# Altium footprint library MCU.PcbLib: 44 footprints (part 2 of 3)
Each footprint in its own frame and in the unit in brackets; x right, y up, seen from the top. Pads: shape width x height; smd on the part's side, far side on the other; paste and mask are expansions set on the pad; w line width, h text height; cw(c..) or ccw(c..) is an arc to the next point about the centre after c.
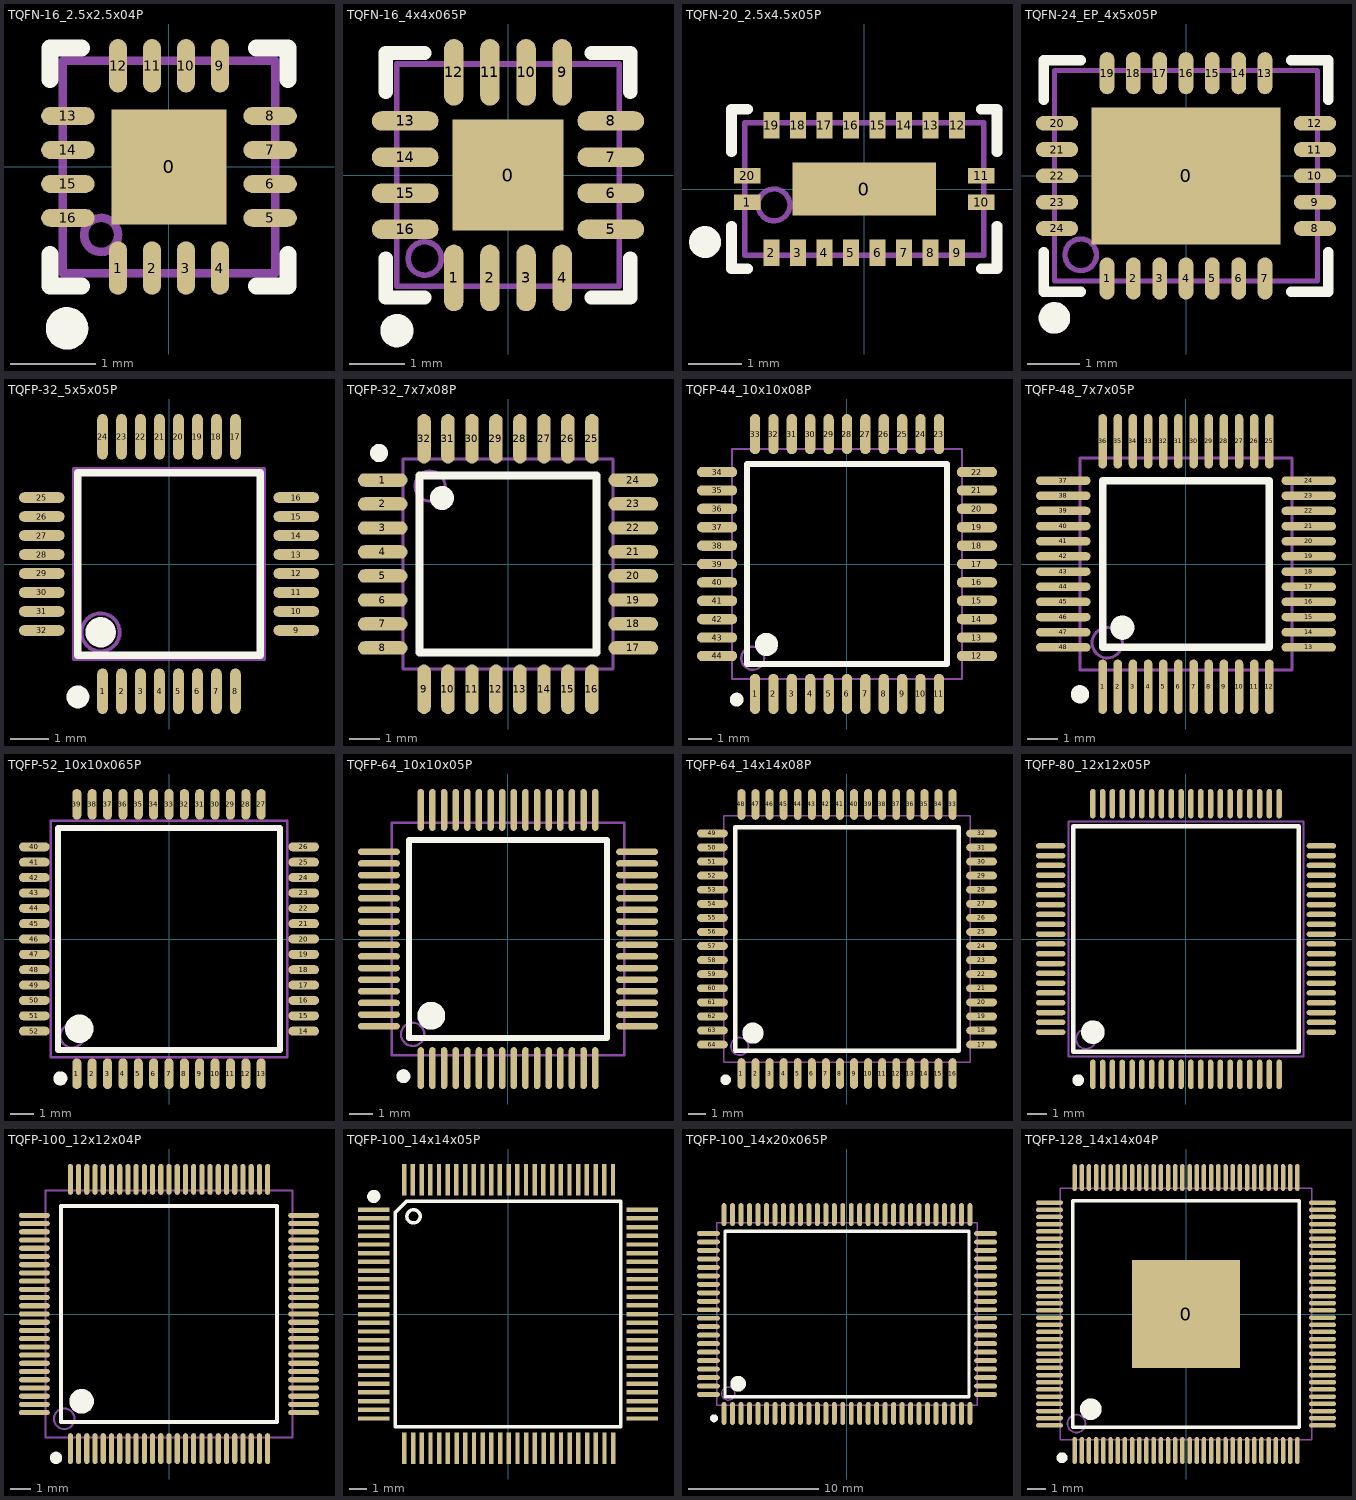
[diagram p1: the footprints below, top view; thin cyan lines are the x and y axes]

## TQFN-16_2.5x2.5x04P [mm] "QFN, 16-Leads, Body 3.00x3.00mm, Pitch 0.50mm, Thermal Pad 1.70x1.70mm, IPC Medium Density"
height 1
pads (17):
  rect 1.35x1.35 smd mask+0.051: 0(0,0)
  oval 0.21x0.63 smd mask+0.051: 1(-0.6,-1.19) 2(-0.2,-1.19) 3(0.2,-1.19) 4(0.6,-1.19) 9(0.6,1.19) 10(0.2,1.19) 11(-0.2,1.19) 12(-0.6,1.19)
  oval 0.63x0.21 smd mask+0.051: 5(1.19,-0.6) 6(1.19,-0.2) 7(1.19,0.2) 8(1.19,0.6) 13(-1.19,0.6) 14(-1.19,0.2) 15(-1.19,-0.2) 16(-1.19,-0.6)
Top Overlay:
  circle w0.25: c-1.2,-1.9 r0.125
  lines w0.2: -1.4,-1.03 -1.4,-1.4 -1.03,-1.4 ; -1.4,1.03 -1.4,1.4 -1.03,1.4 ; 1.03,-1.4 1.4,-1.4 1.4,-1.03 ; 1.03,1.4 1.4,1.4 1.4,1.03
Mechanical 13:
  circle w0.1: c-0.8,-0.8 r0.2
  lines w0.1: -1.25,-1.25 1.25,-1.25 1.25,1.25 -1.25,1.25 -1.25,-1.25

## TQFN-16_4x4x065P [mm] "QFN, 16-Leads, Body 3.00x3.00mm, Pitch 0.50mm, Thermal Pad 1.70x1.70mm, IPC Medium Density"
height 1
pads (17):
  rect 2x2 smd mask+0.051: 0(0,0)
  oval 0.35x1.2 smd mask+0.051: 1(-0.975,-1.85) 2(-0.325,-1.85) 3(0.325,-1.85) 4(0.975,-1.85) 9(0.975,1.85) 10(0.325,1.85) 11(-0.325,1.85) 12(-0.975,1.85)
  oval 1.2x0.35 smd mask+0.051: 5(1.85,-0.975) 6(1.85,-0.325) 7(1.85,0.325) 8(1.85,0.975) 13(-1.85,0.975) 14(-1.85,0.325) 15(-1.85,-0.325) 16(-1.85,-0.975)
Top Overlay:
  circle w0.3: c-2,-2.8 r0.15
  lines w0.254: -2.2,-1.5 -2.2,-2.2 -1.5,-2.2 ; -2.2,1.5 -2.2,2.2 -1.5,2.2 ; 1.5,-2.2 2.2,-2.2 2.2,-1.5 ; 1.5,2.2 2.2,2.2 2.2,1.5
Mechanical 13:
  circle w0.1: c-1.5,-1.5 r0.3
  lines w0.1: -2,-2 -2,2 2,2 2,-2 -2,-2

## TQFN-20_2.5x4.5x05P [mm]
pads (21):
  rect 2.7x1 smd mask+0.051: 0(0,0)
  rect 0.5x0.3 smd mask+0.051: 1(-2.2,-0.25) 10(2.2,-0.25) 11(2.2,0.25) 20(-2.2,0.25)
  rect 0.3x0.5 smd mask+0.051: 2(-1.75,-1.2) 3(-1.25,-1.2) 4(-0.75,-1.2) 5(-0.25,-1.2) 6(0.25,-1.2) 7(0.75,-1.2) 8(1.25,-1.2) 9(1.75,-1.2) 12(1.75,1.2) 13(1.25,1.2) 14(0.75,1.2) 15(0.25,1.2) 16(-0.25,1.2) 17(-0.75,1.2) 18(-1.25,1.2) 19(-1.75,1.2)
Top Overlay:
  circle w0.3: c-3,-1 r0.15
  lines w0.2: -2.5,-0.7 -2.5,-1.5 -2.2,-1.5 ; -2.5,0.7 -2.5,1.5 -2.2,1.5 ; 2.2,-1.5 2.5,-1.5 2.5,-0.7 ; 2.2,1.5 2.5,1.5 2.5,0.7
Mechanical 13:
  circle w0.1: c-1.7,-0.3 r0.3
  lines w0.1: -2.25,-1.25 2.25,-1.25 2.25,1.25 -2.25,1.25 -2.25,-1.25

## TQFN-24_EP_4x5x05P [mm]
pads (25):
  rect 3.6x2.6 smd mask+0.051: 0(0,0)
  oval 0.28x0.8 smd mask+0.051: 1(-1.5,-1.95) 2(-1,-1.95) 3(-0.5,-1.95) 4(0,-1.95) 5(0.5,-1.95) 6(1,-1.95) 7(1.5,-1.95) 13(1.5,1.95) 14(1,1.95) 15(0.5,1.95) 16(0,1.95) 17(-0.5,1.95) 18(-1,1.95) 19(-1.5,1.95)
  oval 0.8x0.28 smd mask+0.051: 8(2.45,-1) 9(2.45,-0.5) 10(2.45,0) 11(2.45,0.5) 12(2.45,1) 20(-2.45,1) 21(-2.45,0.5) 22(-2.45,0) 23(-2.45,-0.5) 24(-2.45,-1)
Top Overlay:
  circle w0.3: c-2.5,-2.7 r0.15
  lines w0.2: -2.7,-1.45 -2.7,-2.2 -2,-2.2 ; -2.7,1.45 -2.7,2.2 -2,2.2 ; 2,-2.2 2.7,-2.2 2.7,-1.45 ; 2,2.2 2.7,2.2 2.7,1.45
Mechanical 13:
  circle w0.1: c-2,-1.5 r0.3
  lines w0.1: -2.5,-2 2.5,-2 2.5,2 -2.5,2 -2.5,-2

## TQFP-32_5x5x05P [mm]
pads (32):
  oval 0.28x1.2 smd mask+0.051: 1(-1.75,-3.35) 2(-1.25,-3.35) 3(-0.75,-3.35) 4(-0.25,-3.35) 5(0.25,-3.35) 6(0.75,-3.35) 7(1.25,-3.35) 8(1.75,-3.35) 17(1.75,3.35) 18(1.25,3.35) 19(0.75,3.35) 20(0.25,3.35) 21(-0.25,3.35) 22(-0.75,3.35) 23(-1.25,3.35) 24(-1.75,3.35)
  oval 1.2x0.28 smd mask+0.051: 9(3.35,-1.75) 10(3.35,-1.25) 11(3.35,-0.75) 12(3.35,-0.25) 13(3.35,0.25) 14(3.35,0.75) 15(3.35,1.25) 16(3.35,1.75) 25(-3.35,1.75) 26(-3.35,1.25) 27(-3.35,0.75) 28(-3.35,0.25) 29(-3.35,-0.25) 30(-3.35,-0.75) 31(-3.35,-1.25) 32(-3.35,-1.75)
Top Overlay:
  circle w0.3: c-2.4,-3.5 r0.15
  circle w0.4: c-1.8,-1.8 r0.2
  lines w0.2: -2.4,-2.4 -2.4,2.4 2.4,2.4 2.4,-2.4 -2.4,-2.4
Mechanical 13:
  circle w0.1: c-1.8,-1.8 r0.5
  lines w0.1: -2.5,-2.5 -2.5,2.5 2.5,2.5 2.5,-2.5 -2.5,-2.5

## TQFP-32_7x7x08P [mm]
pads (32):
  oval 1.65x0.45 smd: 1(-4.175,2.8) 2(-4.175,2) 3(-4.175,1.2) 4(-4.175,0.4) 5(-4.175,-0.4) 6(-4.175,-1.2) 7(-4.175,-2) 8(-4.175,-2.8) 17(4.175,-2.8) 18(4.175,-2) 19(4.175,-1.2) 20(4.175,-0.4) 21(4.175,0.4) 22(4.175,1.2) 23(4.175,2) 24(4.175,2.8)
  oval 0.45x1.65 smd: 9(-2.8,-4.175) 10(-2,-4.175) 11(-1.2,-4.175) 12(-0.4,-4.175) 13(0.4,-4.175) 14(1.2,-4.175) 15(2,-4.175) 16(2.8,-4.175) 25(2.8,4.175) 26(2,4.175) 27(1.2,4.175) 28(0.4,4.175) 29(-0.4,4.175) 30(-1.2,4.175) 31(-2,4.175) 32(-2.8,4.175)
Top Overlay:
  circle w0.3: c-4.3,3.7 r0.15
  circle w0.4: c-2.2,2.2 r0.2
  lines w0.254: -2.95,-2.95 2.95,-2.95 2.95,2.95 -2.95,2.95 -2.95,-2.95
Mechanical 13:
  circle w0.1: c-2.6,2.6 r0.5
  lines w0.1: -3.5,-3.5 3.5,-3.5 3.5,3.5 -3.5,3.5 -3.5,-3.5
3D body: height 1.13, standoff 0.03, extent -4.794,-4.806 4.806,4.794

## TQFP-44_10x10x08P [mm]
pads (44):
  oval 0.45x1.75 smd: 1(-4,-5.65) 2(-3.2,-5.65) 3(-2.4,-5.65) 4(-1.6,-5.65) 5(-0.8,-5.65) 6(0,-5.65) 7(0.8,-5.65) 8(1.6,-5.65) 9(2.4,-5.65) 10(3.2,-5.65) 11(4,-5.65) 23(4,5.65) 24(3.2,5.65) 25(2.4,5.65) 26(1.6,5.65) 27(0.8,5.65) 28(0,5.65) 29(-0.8,5.65) 30(-1.6,5.65) 31(-2.4,5.65) 32(-3.2,5.65) 33(-4,5.65)
  oval 1.75x0.45 smd: 12(5.65,-4) 13(5.65,-3.2) 14(5.65,-2.4) 15(5.65,-1.6) 16(5.65,-0.8) 17(5.65,0) 18(5.65,0.8) 19(5.65,1.6) 20(5.65,2.4) 21(5.65,3.2) 22(5.65,4) 34(-5.65,4) 35(-5.65,3.2) 36(-5.65,2.4) 37(-5.65,1.6) 38(-5.65,0.8) 39(-5.65,0) 40(-5.65,-0.8) 41(-5.65,-1.6) 42(-5.65,-2.4) 43(-5.65,-3.2) 44(-5.65,-4)
Top Overlay:
  circle w0.3: c-4.8,-5.9 r0.15
  circle w0.5: c-3.5,-3.5 r0.25
  lines w0.254: -4.35,-4.35 4.35,-4.35 4.35,4.35 -4.35,4.35 -4.35,-4.35
Mechanical 13:
  circle w0.1: c-4.1,-4.1 r0.5
  lines w0.1: -5,-5 5,-5 5,5 -5,5 -5,-5
3D body: height 1.1, standoff 0, extent -6.02,-6.025 5.98,5.975

## TQFP-48_7x7x05P [mm]
pads (48):
  oval 0.28x1.8 smd mask+0.051: 1(-2.75,-4.05) 2(-2.25,-4.05) 3(-1.75,-4.05) 4(-1.25,-4.05) 5(-0.75,-4.05) 6(-0.25,-4.05) 7(0.25,-4.05) 8(0.75,-4.05) 9(1.25,-4.05) 10(1.75,-4.05) 11(2.25,-4.05) 12(2.75,-4.05) 25(2.75,4.05) 26(2.25,4.05) 27(1.75,4.05) 28(1.25,4.05) 29(0.75,4.05) 30(0.25,4.05) 31(-0.25,4.05) 32(-0.75,4.05) 33(-1.25,4.05) 34(-1.75,4.05) 35(-2.25,4.05) 36(-2.75,4.05)
  oval 1.8x0.28 smd mask+0.051: 13(4.05,-2.75) 14(4.05,-2.25) 15(4.05,-1.75) 16(4.05,-1.25) 17(4.05,-0.75) 18(4.05,-0.25) 19(4.05,0.25) 20(4.05,0.75) 21(4.05,1.25) 22(4.05,1.75) 23(4.05,2.25) 24(4.05,2.75) 37(-4.05,2.75) 38(-4.05,2.25) 39(-4.05,1.75) 40(-4.05,1.25) 41(-4.05,0.75) 42(-4.05,0.25) 43(-4.05,-0.25) 44(-4.05,-0.75) 45(-4.05,-1.25) 46(-4.05,-1.75) 47(-4.05,-2.25) 48(-4.05,-2.75)
Top Overlay:
  circle w0.4: c-2.1,-2.1 r0.2
  circle w0.3: c-3.5,-4.3 r0.15
  lines w0.254: -2.75,-2.75 -2.75,2.75 2.75,2.75 2.75,-2.75 -2.75,-2.75
Mechanical 13:
  circle w0.1: c-2.6,-2.6 r0.5
  lines w0.1: -3.5,-3.5 -3.5,3.5 3.5,3.5 3.5,-3.5 -3.5,-3.5

## TQFP-52_10x10x065P [mm]
pads (52):
  oval 0.38x1.3 smd mask+0.051: 1(-3.9,-5.7) 2(-3.25,-5.7) 3(-2.6,-5.7) 4(-1.95,-5.7) 5(-1.3,-5.7) 6(-0.65,-5.7) 7(0,-5.7) 8(0.65,-5.7) 9(1.3,-5.7) 10(1.95,-5.7) 11(2.6,-5.7) 12(3.25,-5.7) 13(3.9,-5.7) 27(3.9,5.7) 28(3.25,5.7) 29(2.6,5.7) 30(1.95,5.7) 31(1.3,5.7) 32(0.65,5.7) 33(0,5.7) 34(-0.65,5.7) 35(-1.3,5.7) 36(-1.95,5.7) 37(-2.6,5.7) 38(-3.25,5.7) 39(-3.9,5.7)
  oval 1.3x0.38 smd mask+0.051: 14(5.7,-3.9) 15(5.7,-3.25) 16(5.7,-2.6) 17(5.7,-1.95) 18(5.7,-1.3) 19(5.7,-0.65) 20(5.7,0) 21(5.7,0.65) 22(5.7,1.3) 23(5.7,1.95) 24(5.7,2.6) 25(5.7,3.25) 26(5.7,3.9) 40(-5.7,3.9) 41(-5.7,3.25) 42(-5.7,2.6) 43(-5.7,1.95) 44(-5.7,1.3) 45(-5.7,0.65) 46(-5.7,0) 47(-5.7,-0.65) 48(-5.7,-1.3) 49(-5.7,-1.95) 50(-5.7,-2.6) 51(-5.7,-3.25) 52(-5.7,-3.9)
Top Overlay:
  circle w0.3: c-4.6,-5.9 r0.15
  circle w0.6: c-3.8,-3.8 r0.3
  lines w0.254: -4.7,-4.7 -4.7,4.7 4.7,4.7 4.7,-4.7 -4.7,-4.7
Mechanical 13:
  circle w0.1: c-4.1,-4.1 r0.5
  lines w0.1: -5,-5 -5,5 5,5 5,-5 -5,-5

## TQFP-64_10x10x05P [mm]
pads (64):
  oval 0.28x1.8 smd mask+0.051: 1(-3.75,-5.55) 2(-3.25,-5.55) 3(-2.75,-5.55) 4(-2.25,-5.55) 5(-1.75,-5.55) 6(-1.25,-5.55) 7(-0.75,-5.55) 8(-0.25,-5.55) 9(0.25,-5.55) 10(0.75,-5.55) 11(1.25,-5.55) 12(1.75,-5.55) 13(2.25,-5.55) 14(2.75,-5.55) 15(3.25,-5.55) 16(3.75,-5.55) 33(3.75,5.55) 34(3.25,5.55) 35(2.75,5.55) 36(2.25,5.55) 37(1.75,5.55) 38(1.25,5.55) 39(0.75,5.55) 40(0.25,5.55) 41(-0.25,5.55) 42(-0.75,5.55) 43(-1.25,5.55) 44(-1.75,5.55) 45(-2.25,5.55) 46(-2.75,5.55) 47(-3.25,5.55) 48(-3.75,5.55)
  oval 1.8x0.28 smd mask+0.051: 17(5.55,-3.75) 18(5.55,-3.25) 19(5.55,-2.75) 20(5.55,-2.25) 21(5.55,-1.75) 22(5.55,-1.25) 23(5.55,-0.75) 24(5.55,-0.25) 25(5.55,0.25) 26(5.55,0.75) 27(5.55,1.25) 28(5.55,1.75) 29(5.55,2.25) 30(5.55,2.75) 31(5.55,3.25) 32(5.55,3.75) 49(-5.55,3.75) 50(-5.55,3.25) 51(-5.55,2.75) 52(-5.55,2.25) 53(-5.55,1.75) 54(-5.55,1.25) 55(-5.55,0.75) 56(-5.55,0.25) 57(-5.55,-0.25) 58(-5.55,-0.75) 59(-5.55,-1.25) 60(-5.55,-1.75) 61(-5.55,-2.25) 62(-5.55,-2.75) 63(-5.55,-3.25) 64(-5.55,-3.75)
Top Overlay:
  circle w0.3: c-4.5,-5.9 r0.15
  circle w0.6: c-3.3,-3.3 r0.3
  lines w0.254: -4.25,-4.25 -4.25,4.25 4.25,4.25 4.25,-4.25 -4.25,-4.25
Mechanical 13:
  circle w0.1: c-4.1,-4.1 r0.5
  lines w0.1: -5,-5 -5,5 5,5 5,-5 -5,-5

## TQFP-64_14x14x08P [mm]
pads (64):
  oval 0.45x1.75 smd: 1(-6,-7.65) 2(-5.2,-7.65) 3(-4.4,-7.65) 4(-3.6,-7.65) 5(-2.8,-7.65) 6(-2,-7.65) 7(-1.2,-7.65) 8(-0.4,-7.65) 9(0.4,-7.65) 10(1.2,-7.65) 11(2,-7.65) 12(2.8,-7.65) 13(3.6,-7.65) 14(4.4,-7.65) 15(5.2,-7.65) 16(6,-7.65) 33(6,7.65) 34(5.2,7.65) 35(4.4,7.65) 36(3.6,7.65) 37(2.8,7.65) 38(2,7.65) 39(1.2,7.65) 40(0.4,7.65) 41(-0.4,7.65) 42(-1.2,7.65) 43(-2,7.65) 44(-2.8,7.65) 45(-3.6,7.65) 46(-4.4,7.65) 47(-5.2,7.65) 48(-6,7.65)
  oval 1.75x0.45 smd: 17(7.65,-6) 18(7.65,-5.2) 19(7.65,-4.4) 20(7.65,-3.6) 21(7.65,-2.8) 22(7.65,-2) 23(7.65,-1.2) 24(7.65,-0.4) 25(7.65,0.4) 26(7.65,1.2) 27(7.65,2) 28(7.65,2.8) 29(7.65,3.6) 30(7.65,4.4) 31(7.65,5.2) 32(7.65,6) 49(-7.65,6) 50(-7.65,5.2) 51(-7.65,4.4) 52(-7.65,3.6) 53(-7.65,2.8) 54(-7.65,2) 55(-7.65,1.2) 56(-7.65,0.4) 57(-7.65,-0.4) 58(-7.65,-1.2) 59(-7.65,-2) 60(-7.65,-2.8) 61(-7.65,-3.6) 62(-7.65,-4.4) 63(-7.65,-5.2) 64(-7.65,-6)
Top Overlay:
  circle w0.3: c-6.9,-8 r0.15
  circle w0.6: c-5.35,-5.35 r0.3
  lines w0.254: -6.35,-6.35 -6.35,6.35 6.35,6.35 6.35,-6.35 -6.35,-6.35
Mechanical 13:
  circle w0.1: c-6.1,-6.1 r0.5
  lines w0.1: -7,-7 -7,7 7,7 7,-7 -7,-7

## TQFP-80_12x12x05P [mm]
pads (81):
  oval 0.28x1.5 smd mask+0.051: 1(-4.75,-6.9) 2(-4.25,-6.9) 3(-3.75,-6.9) 4(-3.25,-6.9) 5(-2.75,-6.9) 6(-2.25,-6.9) 7(-1.75,-6.9) 8(-1.25,-6.9) 9(-0.75,-6.9) 10(-0.25,-6.9) 11(0.25,-6.9) 12(0.75,-6.9) 13(1.25,-6.9) 14(1.75,-6.9) 15(2.25,-6.9) 16(2.75,-6.9) 17(3.25,-6.9) 18(3.75,-6.9) 19(4.25,-6.9) 20(4.75,-6.9) 41(4.75,6.9) 42(4.25,6.9) 43(3.75,6.9) 44(3.25,6.9) 45(2.75,6.9) 46(2.25,6.9) 47(1.75,6.9) 48(1.25,6.9) 49(0.75,6.9) 50(0.25,6.9) 51(-0.25,6.9) 52(-0.75,6.9) 53(-1.25,6.9) 54(-1.75,6.9) 55(-2.25,6.9) 56(-2.75,6.9) 57(-3.25,6.9) 58(-3.75,6.9) 59(-4.25,6.9) 60(-4.75,6.9)
  oval 1.5x0.28 smd mask+0.051: 21(6.9,-4.75) 22(6.9,-4.25) 23(6.9,-3.75) 24(6.9,-3.25) 25(6.9,-2.75) 26(6.9,-2.25) 27(6.9,-1.75) 28(6.9,-1.25) 29(6.9,-0.75) 30(6.9,-0.25) 31(6.9,0.25) 32(6.9,0.75) 33(6.9,1.25) 34(6.9,1.75) 35(6.9,2.25) 36(6.9,2.75) 37(6.9,3.25) 38(6.9,3.75) 39(6.9,4.25) 40(6.9,4.75) 61(-6.9,4.75) 62(-6.9,4.25) 63(-6.9,3.75) 64(-6.9,3.25) 65(-6.9,2.75) 66(-6.9,2.25) 67(-6.9,1.75) 68(-6.9,1.25) 69(-6.9,0.75) 70(-6.9,0.25) 71(-6.9,-0.25) 72(-6.9,-0.75) 73(-6.9,-1.25) 74(-6.9,-1.75) 75(-6.9,-2.25) 76(-6.9,-2.75) 77(-6.9,-3.25) 78(-6.9,-3.75) 79(-6.9,-4.25) 80(-6.9,-4.75)
  oval 1.5x0 smd mask+0.051: 74(-6.9,-1.75)
Top Overlay:
  circle w0.6: c-4.75,-4.75 r0.3
  circle w0.3: c-5.5,-7.2 r0.15
  lines w0.254: -5.75,-5.75 5.75,-5.75 5.75,5.75 -5.75,5.75 -5.75,-5.75
Mechanical 13:
  circle w0.1: c-5.1,-5.1 r0.5
  lines w0.1: -6,-6 6,-6 6,6 -6,6 -6,-6

## TQFP-100_12x12x04P [mm]
pads (100):
  oval 0.25x1.5 smd mask+0.051: 1(-4.8,-6.55) 2(-4.4,-6.55) 3(-4,-6.55) 4(-3.6,-6.55) 5(-3.2,-6.55) 6(-2.8,-6.55) 7(-2.4,-6.55) 8(-2,-6.55) 9(-1.6,-6.55) 10(-1.2,-6.55) 11(-0.8,-6.55) 12(-0.4,-6.55) 13(0,-6.55) 14(0.4,-6.55) 15(0.8,-6.55) 16(1.2,-6.55) 17(1.6,-6.55) 18(2,-6.55) 19(2.4,-6.55) 20(2.8,-6.55) 21(3.2,-6.55) 22(3.6,-6.55) 23(4,-6.55) 24(4.4,-6.55) 25(4.8,-6.55) 51(4.8,6.55) 52(4.4,6.55) 53(4,6.55) 54(3.6,6.55) 55(3.2,6.55) 56(2.8,6.55) 57(2.4,6.55) 58(2,6.55) 59(1.6,6.55) 60(1.2,6.55) 61(0.8,6.55) 62(0.4,6.55) 63(0,6.55) 64(-0.4,6.55) 65(-0.8,6.55) 66(-1.2,6.55) 67(-1.6,6.55) 68(-2,6.55) 69(-2.4,6.55) 70(-2.8,6.55) 71(-3.2,6.55) 72(-3.6,6.55) 73(-4,6.55) 74(-4.4,6.55) 75(-4.8,6.55)
  oval 1.5x0.25 smd mask+0.051: 26(6.55,-4.8) 27(6.55,-4.4) 28(6.55,-4) 29(6.55,-3.6) 30(6.55,-3.2) 31(6.55,-2.8) 32(6.55,-2.4) 33(6.55,-2) 34(6.55,-1.6) 35(6.55,-1.2) 36(6.55,-0.8) 37(6.55,-0.4) 38(6.55,0) 39(6.55,0.4) 40(6.55,0.8) 41(6.55,1.2) 42(6.55,1.6) 43(6.55,2) 44(6.55,2.4) 45(6.55,2.8) 46(6.55,3.2) 47(6.55,3.6) 48(6.55,4) 49(6.55,4.4) 50(6.55,4.8) 76(-6.55,4.8) 77(-6.55,4.4) 78(-6.55,4) 79(-6.55,3.6) 80(-6.55,3.2) 81(-6.55,2.8) 82(-6.55,2.4) 83(-6.55,2) 84(-6.55,1.6) 85(-6.55,1.2) 86(-6.55,0.8) 87(-6.55,0.4) 88(-6.55,0) 89(-6.55,-0.4) 90(-6.55,-0.8) 91(-6.55,-1.2) 92(-6.55,-1.6) 93(-6.55,-2) 94(-6.55,-2.4) 95(-6.55,-2.8) 96(-6.55,-3.2) 97(-6.55,-3.6) 98(-6.55,-4) 99(-6.55,-4.4) 100(-6.55,-4.8)
Top Overlay:
  circle w0.3: c-5.5,-7 r0.15
  circle w0.6: c-4.25,-4.25 r0.3
  lines w0.2: -5.25,-5.25 -5.25,5.25 5.25,5.25 5.25,-5.25 -5.25,-5.25
Mechanical 13:
  circle w0.1: c-5.1,-5.1 r0.5
  lines w0.1: -6,-6 -6,6 6,6 6,-6 -6,-6

## TQFP-100_14x14x05P [mm]
pads (100):
  rect 1.8x0.254 smd: 1(-7.716,5.994) 2(-7.716,5.494) 3(-7.716,4.994) 4(-7.716,4.494) 5(-7.716,3.994) 6(-7.716,3.494) 7(-7.716,2.994) 8(-7.716,2.494) 9(-7.716,1.994) 10(-7.716,1.494) 11(-7.716,0.994) 12(-7.716,0.494) 13(-7.716,-0.006) 14(-7.716,-0.506) 15(-7.716,-1.006) 16(-7.716,-1.506) 17(-7.716,-2.006) 18(-7.716,-2.506) 19(-7.716,-3.006) 20(-7.716,-3.506) 21(-7.716,-4.006) 22(-7.716,-4.506) 23(-7.716,-5.006) 24(-7.716,-5.506) 25(-7.716,-6.006) 51(7.716,-6.006) 52(7.716,-5.506) 53(7.716,-5.006) 54(7.716,-4.506) 55(7.716,-4.006) 56(7.716,-3.506) 57(7.716,-3.006) 58(7.716,-2.506) 59(7.716,-2.006) 60(7.716,-1.506) 61(7.716,-1.006) 62(7.716,-0.506) 63(7.716,-0.006) 64(7.716,0.494) 65(7.716,0.994) 66(7.716,1.494) 67(7.716,1.994) 68(7.716,2.494) 69(7.716,2.994) 70(7.716,3.494) 71(7.716,3.994) 72(7.716,4.494) 73(7.716,4.994) 74(7.716,5.494) 75(7.716,5.994)
  rect 0.254x1.8 smd: 26(-5.954,-7.722) 27(-5.454,-7.722) 28(-4.954,-7.722) 29(-4.454,-7.722) 30(-3.954,-7.722) 31(-3.454,-7.722) 32(-2.954,-7.722) 33(-2.454,-7.722) 34(-1.954,-7.722) 35(-1.454,-7.722) 36(-0.954,-7.722) 37(-0.454,-7.722) 38(0.046,-7.722) 39(0.546,-7.722) 40(1.046,-7.722) 41(1.546,-7.722) 42(2.046,-7.722) 43(2.546,-7.722) 44(3.046,-7.722) 45(3.546,-7.722) 46(4.046,-7.722) 47(4.546,-7.722) 48(5.046,-7.722) 49(5.546,-7.722) 50(6.046,-7.722) 76(6.033,7.722) 77(5.534,7.721) 78(5.034,7.721) 79(4.534,7.721) 80(4.034,7.721) 81(3.534,7.721) 82(3.034,7.721) 83(2.534,7.721) 84(2.034,7.721) 85(1.534,7.721) 86(1.034,7.721) 87(0.534,7.721) 88(0.034,7.721) 89(-0.466,7.721) 90(-0.966,7.721) 91(-1.466,7.721) 92(-1.966,7.721) 93(-2.466,7.721) 94(-2.966,7.721) 95(-3.466,7.721) 96(-3.966,7.721) 97(-4.466,7.721) 98(-4.966,7.721) 99(-5.466,7.721) 100(-5.966,7.721)
Top Overlay:
  circle w0.5: c-7.716,6.756 r0.127
  circle w0.2: c-5.43,5.613 r0.381
  lines w0.2: -6.477,-6.477 -6.477,5.836 -5.836,6.477 6.477,6.477 6.477,-6.477 -6.477,-6.477
3D body: height 1.56, standoff -0.06, extent -7.97,-7.975 8.03,8.025

## TQFP-100_14x20x065P [mm]
pads (100):
  oval 0.38x1.75 smd mask+0.051: 1(-9.425,-7.625) 2(-8.775,-7.625) 3(-8.125,-7.625) 4(-7.475,-7.625) 5(-6.825,-7.625) 6(-6.175,-7.625) 7(-5.525,-7.625) 8(-4.875,-7.625) 9(-4.225,-7.625) 10(-3.575,-7.625) 11(-2.925,-7.625) 12(-2.275,-7.625) 13(-1.625,-7.625) 14(-0.975,-7.625) 15(-0.325,-7.625) 16(0.325,-7.625) 17(0.975,-7.625) 18(1.625,-7.625) 19(2.275,-7.625) 20(2.925,-7.625) 21(3.575,-7.625) 22(4.225,-7.625) 23(4.875,-7.625) 24(5.525,-7.625) 25(6.175,-7.625) 26(6.825,-7.625) 27(7.475,-7.625) 28(8.125,-7.625) 29(8.775,-7.625) 30(9.425,-7.625) 51(9.425,7.625) 52(8.775,7.625) 53(8.125,7.625) 54(7.475,7.625) 55(6.825,7.625) 56(6.175,7.625) 57(5.525,7.625) 58(4.875,7.625) 59(4.225,7.625) 60(3.575,7.625) 61(2.925,7.625) 62(2.275,7.625) 63(1.625,7.625) 64(0.975,7.625) 65(0.325,7.625) 66(-0.325,7.625) 67(-0.975,7.625) 68(-1.625,7.625) 69(-2.275,7.625) 70(-2.925,7.625) 71(-3.575,7.625) 72(-4.225,7.625) 73(-4.875,7.625) 74(-5.525,7.625) 75(-6.175,7.625) 76(-6.825,7.625) 77(-7.475,7.625) 78(-8.125,7.625) 79(-8.775,7.625) 80(-9.425,7.625)
  oval 1.75x0.38 smd mask+0.051: 31(10.625,-6.175) 32(10.625,-5.525) 33(10.625,-4.875) 34(10.625,-4.225) 35(10.625,-3.575) 36(10.625,-2.925) 37(10.625,-2.275) 38(10.625,-1.625) 39(10.625,-0.975) 40(10.625,-0.325) 41(10.625,0.325) 42(10.625,0.975) 43(10.625,1.625) 44(10.625,2.275) 45(10.625,2.925) 46(10.625,3.575) 47(10.625,4.225) 48(10.625,4.875) 49(10.625,5.525) 50(10.625,6.175) 81(-10.625,6.175) 82(-10.625,5.525) 83(-10.625,4.875) 84(-10.625,4.225) 85(-10.625,3.575) 86(-10.625,2.925) 87(-10.625,2.275) 88(-10.625,1.625) 89(-10.625,0.975) 90(-10.625,0.325) 91(-10.625,-0.325) 92(-10.625,-0.975) 93(-10.625,-1.625) 94(-10.625,-2.275) 95(-10.625,-2.925) 96(-10.625,-3.575) 97(-10.625,-4.225) 98(-10.625,-4.875) 99(-10.625,-5.525) 100(-10.625,-6.175)
Top Overlay:
  circle w0.6: c-8.35,-5.35 r0.3
  circle w0.3: c-10.2,-8 r0.15
  lines w0.254: -9.35,-6.35 -9.35,6.35 9.35,6.35 9.35,-6.35 -9.35,-6.35
Mechanical 13:
  circle w0.1: c-9.1,-6.1 r0.5
  lines w0.1: -10,-7 -10,7 10,7 10,-7 -10,-7

## TQFP-128_14x14x04P [mm]
pads (129):
  rect 6x6 smd mask+0.051: 0(0,0)
  oval 0.25x1.5 smd mask+0.051: 1(-6.2,-7.6) 2(-5.8,-7.6) 3(-5.4,-7.6) 4(-5,-7.6) 5(-4.6,-7.6) 6(-4.2,-7.6) 7(-3.8,-7.6) 8(-3.4,-7.6) 9(-3,-7.6) 10(-2.6,-7.6) 11(-2.2,-7.6) 12(-1.8,-7.6) 13(-1.4,-7.6) 14(-1,-7.6) 15(-0.6,-7.6) 16(-0.2,-7.6) 17(0.2,-7.6) 18(0.6,-7.6) 19(1,-7.6) 20(1.4,-7.6) 21(1.8,-7.6) 22(2.2,-7.6) 23(2.6,-7.6) 24(3,-7.6) 25(3.4,-7.6) 26(3.8,-7.6) 27(4.2,-7.6) 28(4.6,-7.6) 29(5,-7.6) 30(5.4,-7.6) 31(5.8,-7.6) 32(6.2,-7.6) 65(6.2,7.6) 66(5.8,7.6) 67(5.4,7.6) 68(5,7.6) 69(4.6,7.6) 70(4.2,7.6) 71(3.8,7.6) 72(3.4,7.6) 73(3,7.6) 74(2.6,7.6) 75(2.2,7.6) 76(1.8,7.6) 77(1.4,7.6) 78(1,7.6) 79(0.6,7.6) 80(0.2,7.6) 81(-0.2,7.6) 82(-0.6,7.6) 83(-1,7.6) 84(-1.4,7.6) 85(-1.8,7.6) 86(-2.2,7.6) 87(-2.6,7.6) 88(-3,7.6) 89(-3.4,7.6) 90(-3.8,7.6) 91(-4.2,7.6) 92(-4.6,7.6) 93(-5,7.6) 94(-5.4,7.6) 95(-5.8,7.6) 96(-6.2,7.6)
  oval 1.5x0.25 smd mask+0.051: 33(7.6,-6.2) 34(7.6,-5.8) 35(7.6,-5.4) 36(7.6,-5) 37(7.6,-4.6) 38(7.6,-4.2) 39(7.6,-3.8) 40(7.6,-3.4) 41(7.6,-3) 42(7.6,-2.6) 43(7.6,-2.2) 44(7.6,-1.8) 45(7.6,-1.4) 46(7.6,-1) 47(7.6,-0.6) 48(7.6,-0.2) 49(7.6,0.2) 50(7.6,0.6) 51(7.6,1) 52(7.6,1.4) 53(7.6,1.8) 54(7.6,2.2) 55(7.6,2.6) 56(7.6,3) 57(7.6,3.4) 58(7.6,3.8) 59(7.6,4.2) 60(7.6,4.6) 61(7.6,5) 62(7.6,5.4) 63(7.6,5.8) 64(7.6,6.2) 97(-7.6,6.2) 98(-7.6,5.8) 99(-7.6,5.4) 100(-7.6,5) 101(-7.6,4.6) 102(-7.6,4.2) 103(-7.6,3.8) 104(-7.6,3.4) 105(-7.6,3) 106(-7.6,2.6) 107(-7.6,2.2) 108(-7.6,1.8) 109(-7.6,1.4) 110(-7.6,1) 111(-7.6,0.6) 112(-7.6,0.2) 113(-7.6,-0.2) 114(-7.6,-0.6) 115(-7.6,-1) 116(-7.6,-1.4) 117(-7.6,-1.8) 118(-7.6,-2.2) 119(-7.6,-2.6) 120(-7.6,-3) 121(-7.6,-3.4) 122(-7.6,-3.8) 123(-7.6,-4.2) 124(-7.6,-4.6) 125(-7.6,-5) 126(-7.6,-5.4) 127(-7.6,-5.8) 128(-7.6,-6.2)
Top Overlay:
  circle w0.3: c-6.9,-8 r0.15
  circle w0.6: c-5.3,-5.3 r0.3
  lines w0.2: -6.3,-6.3 6.3,-6.3 6.3,6.3 -6.3,6.3 -6.3,-6.3
Mechanical 13:
  circle w0.1: c-6.1,-6.1 r0.5
  lines w0.1: -7,-7 7,-7 7,7 -7,7 -7,-7